# Altium footprint library Generic Footprint.PcbLib: 160 footprints (part 17 of 20)
Each footprint in its own frame and in the unit in brackets; x right, y up, seen from the top. Pads: shape width x height; smd on the part's side, far side on the other; paste and mask are expansions set on the pad; w line width, h text height; cw(c..) or ccw(c..) is an arc to the next point about the centre after c.
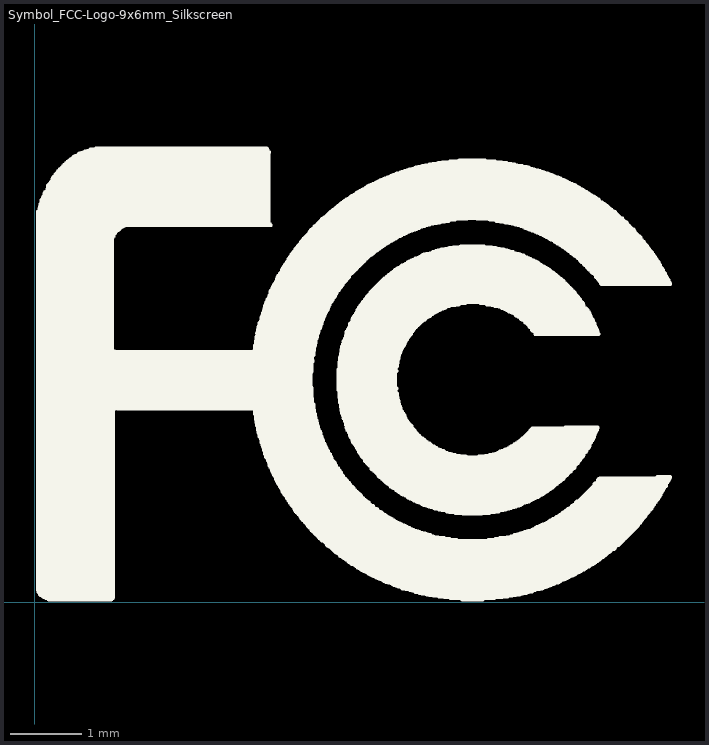
[diagram p16: the footprint, top view; thin cyan lines are the x and y axes]

## Symbol_FCC-Logo-9x6mm_Silkscreen [mm]
pads (8620):
  round 0.06 on Top Overlay: 1(0.042,0.176) 1(0.042,0.186) 1(0.042,0.196) 1(0.042,0.206) 1(0.042,0.216) 1(0.042,0.227) 1(0.042,0.237) 1(0.042,0.247) 1(0.042,0.257) 1(0.042,0.267) 1(0.042,0.278) 1(0.042,0.288) 1(0.042,0.298) 1(0.042,0.308) 1(0.042,0.318) 1(0.042,0.329) 1(0.042,0.339) 1(0.042,0.349) 1(0.042,0.359) 1(0.042,0.369) 1(0.042,0.38) 1(0.042,0.39) 1(0.042,0.4) 1(0.042,0.41) 1(0.042,0.42) 1(0.042,0.431) 1(0.042,0.441) 1(0.042,0.451) 1(0.042,0.461) 1(0.042,0.471) 1(0.042,0.482) 1(0.042,0.492) 1(0.042,0.502) 1(0.042,0.512) 1(0.042,0.522) 1(0.042,0.533) 1(0.042,0.543) 1(0.042,0.553) 1(0.042,0.563) 1(0.042,0.573) 1(0.042,0.584) 1(0.042,0.594) 1(0.042,0.604) 1(0.042,0.614) 1(0.042,0.624) 1(0.042,0.635) 1(0.042,0.645) 1(0.042,0.655) 1(0.042,0.665) 1(0.042,0.675) 1(0.042,0.686) 1(0.042,0.696) 1(0.042,0.706) 1(0.042,0.716) 1(0.042,0.726) 1(0.042,0.737) 1(0.042,0.747) 1(0.042,0.757) 1(0.042,0.767) 1(0.042,0.777) 1(0.042,0.788) 1(0.042,0.798) 1(0.042,0.808) 1(0.042,0.818) 1(0.042,0.828) 1(0.042,0.839) 1(0.042,0.849) 1(0.042,0.859) 1(0.042,0.869) 1(0.042,0.879) 1(0.042,0.89) 1(0.042,0.9) 1(0.042,0.91) 1(0.042,0.92) 1(0.042,0.93) 1(0.042,0.941) 1(0.042,0.951) 1(0.042,0.961) 1(0.042,0.971) 1(0.042,0.981) 1(0.042,0.992) 1(0.042,1.002) 1(0.042,1.012) 1(0.042,1.022) 1(0.042,1.032) 1(0.042,1.043) 1(0.042,1.053) 1(0.042,1.063) 1(0.042,1.073) 1(0.042,1.083) 1(0.042,1.094) 1(0.042,1.104) 1(0.042,1.114) 1(0.042,1.124) 1(0.042,1.134) 1(0.042,1.145) 1(0.042,1.155) 1(0.042,1.165) 1(0.042,1.175) 1(0.042,1.185) 1(0.042,1.196) 1(0.042,1.206) 1(0.042,1.216) 1(0.042,1.226) 1(0.042,1.236) 1(0.042,1.247) 1(0.042,1.257) 1(0.042,1.267) 1(0.042,1.277) 1(0.042,1.287) 1(0.042,1.298) 1(0.042,1.308) 1(0.042,1.318) 1(0.042,1.328) 1(0.042,1.338) 1(0.042,1.349) 1(0.042,1.359) 1(0.042,1.369) 1(0.042,1.379) 1(0.042,1.389) 1(0.042,1.4) 1(0.042,1.41) 1(0.042,1.42) 1(0.042,1.43) 1(0.042,1.44) 1(0.042,1.451) 1(0.042,1.461) 1(0.042,1.471) 1(0.042,1.481) 1(0.042,1.491) 1(0.042,1.502) 1(0.042,1.512) 1(0.042,1.522) 1(0.042,1.532) 1(0.042,1.542) 1(0.042,1.553) 1(0.042,1.563) 1(0.042,1.573) 1(0.042,1.583) 1(0.042,1.593) 1(0.042,1.604) 1(0.042,1.614) 1(0.042,1.624) 1(0.042,1.634) 1(0.042,1.644) 1(0.042,1.655) 1(0.042,1.665) 1(0.042,1.675) 1(0.042,1.685) 1(0.042,1.695) 1(0.042,1.706) 1(0.042,1.716) 1(0.042,1.726) 1(0.042,1.736) 1(0.042,1.746) 1(0.042,1.757) 1(0.042,1.767) 1(0.042,1.777) 1(0.042,1.787) 1(0.042,1.797) 1(0.042,1.808) 1(0.042,1.818) 1(0.042,1.828) 1(0.042,1.838) 1(0.042,1.848) 1(0.042,1.859) 1(0.042,1.869) 1(0.042,1.879) 1(0.042,1.889) 1(0.042,1.899) 1(0.042,1.91) 1(0.042,1.92) 1(0.042,1.93) 1(0.042,1.94) 1(0.042,1.95) 1(0.042,1.961) 1(0.042,1.971) 1(0.042,1.981) 1(0.042,1.991) 1(0.042,2.001) 1(0.042,2.012) 1(0.042,2.022) 1(0.042,2.032) 1(0.042,2.042) 1(0.042,2.052) 1(0.042,2.063) 1(0.042,2.073) 1(0.042,2.083) 1(0.042,2.093) 1(0.042,2.103) 1(0.042,2.114) 1(0.042,2.124) 1(0.042,2.134) 1(0.042,2.144) 1(0.042,2.154) 1(0.042,2.165) 1(0.042,2.175) 1(0.042,2.185) 1(0.042,2.195) 1(0.042,2.205) 1(0.042,2.216) 1(0.042,2.226) 1(0.042,2.236) 1(0.042,2.246) 1(0.042,2.256) 1(0.042,2.267) 1(0.042,2.277) 1(0.042,2.287) 1(0.042,2.297) 1(0.042,2.307) 1(0.042,2.318) 1(0.042,2.328) 1(0.042,2.338) 1(0.042,2.348) 1(0.042,2.358) 1(0.042,2.369) 1(0.042,2.379) 1(0.042,2.389) 1(0.042,2.399) 1(0.042,2.409) 1(0.042,2.42) 1(0.042,2.43) 1(0.042,2.44) 1(0.042,2.45) 1(0.042,2.46) 1(0.042,2.471) 1(0.042,2.481) 1(0.042,2.491) 1(0.042,2.501) 1(0.042,2.511) 1(0.042,2.522) 1(0.042,2.532) 1(0.042,2.542) 1(0.042,2.552) 1(0.042,2.562) 1(0.042,2.573) 1(0.042,2.583) 1(0.042,2.593) 1(0.042,2.603) 1(0.042,2.613) 1(0.042,2.624) 1(0.042,2.634) 1(0.042,2.644) 1(0.042,2.654) 1(0.042,2.664) 1(0.042,2.675) 1(0.042,2.685) 1(0.042,2.695) 1(0.042,2.705) 1(0.042,2.715) 1(0.042,2.726) 1(0.042,2.736) 1(0.042,2.746) 1(0.042,2.756) 1(0.042,2.766) 1(0.042,2.777) 1(0.042,2.787) 1(0.042,2.797) 1(0.042,2.807) 1(0.042,2.817) 1(0.042,2.828) 1(0.042,2.838) 1(0.042,2.848) 1(0.042,2.858) 1(0.042,2.868) 1(0.042,2.879) 1(0.042,2.889) 1(0.042,2.899) 1(0.042,2.909) 1(0.042,2.919) 1(0.042,2.93) 1(0.042,2.94) 1(0.042,2.95) 1(0.042,2.96) 1(0.042,2.97) 1(0.042,2.981) 1(0.042,2.991) 1(0.042,3.001) 1(0.042,3.011) 1(0.042,3.021) 1(0.042,3.032) 1(0.042,3.042) 1(0.042,3.052) 1(0.042,3.062) 1(0.042,3.072) 1(0.042,3.083) 1(0.042,3.093) 1(0.042,3.103) 1(0.042,3.113) 1(0.042,3.123) 1(0.042,3.134) 1(0.042,3.144) 1(0.042,3.154) 1(0.042,3.164) 1(0.042,3.174) 1(0.042,3.185) 1(0.042,3.195) 1(0.042,3.205) 1(0.042,3.215) 1(0.042,3.225) 1(0.042,3.236) 1(0.042,3.246) 1(0.042,3.256) 1(0.042,3.266) 1(0.042,3.276) 1(0.042,3.287) 1(0.042,3.297) 1(0.042,3.307) 1(0.042,3.317) 1(0.042,3.327) 1(0.042,3.338) 1(0.042,3.348) 1(0.042,3.358) 1(0.042,3.368) 1(0.042,3.378) 1(0.042,3.389) 1(0.042,3.399) 1(0.042,3.409) 1(0.042,3.419) 1(0.042,3.429) 1(0.042,3.44) 1(0.042,3.45) 1(0.042,3.46) 1(0.042,3.47) 1(0.042,3.48) 1(0.042,3.491) 1(0.042,3.501) 1(0.042,3.511) 1(0.042,3.521) 1(0.042,3.531) 1(0.042,3.542) 1(0.042,3.552) 1(0.042,3.562) 1(0.042,3.572) 1(0.042,3.582) 1(0.042,3.593) 1(0.042,3.603) 1(0.042,3.613) 1(0.042,3.623) 1(0.042,3.633) 1(0.042,3.644) 1(0.042,3.654) 1(0.042,3.664) 1(0.042,3.674) 1(0.042,3.684) 1(0.042,3.695) 1(0.042,3.705) 1(0.042,3.715) 1(0.042,3.725) 1(0.042,3.735) 1(0.042,3.746) 1(0.042,3.756) 1(0.042,3.766) 1(0.042,3.776) 1(0.042,3.786) 1(0.042,3.797) 1(0.042,3.807) 1(0.042,3.817) 1(0.042,3.827) 1(0.042,3.837) 1(0.042,3.848) 1(0.042,3.858) 1(0.042,3.868) 1(0.042,3.878) 1(0.042,3.888) 1(0.042,3.899) 1(0.042,3.909) 1(0.042,3.919) 1(0.042,3.929) 1(0.042,3.939) 1(0.042,3.95) 1(0.042,3.96) 1(0.042,3.97) 1(0.042,3.98) 1(0.042,3.99) 1(0.042,4.001) 1(0.042,4.011) 1(0.042,4.021) 1(0.042,4.031) 1(0.042,4.041) 1(0.042,4.052) 1(0.042,4.062) 1(0.042,4.072) 1(0.042,4.082) 1(0.042,4.092) 1(0.042,4.103) 1(0.042,4.113) 1(0.042,4.123) 1(0.042,4.133) 1(0.042,4.143) 1(0.042,4.154) 1(0.042,4.164) 1(0.042,4.174) 1(0.042,4.184) 1(0.042,4.194) 1(0.042,4.205) 1(0.042,4.215) 1(0.042,4.225) 1(0.042,4.235) 1(0.042,4.245) 1(0.042,4.256) 1(0.042,4.266) 1(0.042,4.276) 1(0.042,4.286) 1(0.042,4.296) 1(0.042,4.307) 1(0.042,4.317) 1(0.042,4.327) 1(0.042,4.337) 1(0.042,4.347) 1(0.042,4.358) 1(0.042,4.368) 1(0.042,4.378) 1(0.042,4.388) 1(0.042,4.398) 1(0.042,4.409) 1(0.042,4.419) 1(0.042,4.429) 1(0.042,4.439) 1(0.042,4.449) 1(0.042,4.46) 1(0.042,4.47) 1(0.042,4.48) 1(0.042,4.49) 1(0.042,4.5) 1(0.042,4.511) 1(0.042,4.521) 1(0.042,4.531) 1(0.042,4.541) 1(0.042,4.551) 1(0.042,4.562) 1(0.042,4.572) 1(0.042,4.582) 1(0.042,4.592) 1(0.042,4.602) 1(0.042,4.613) 1(0.042,4.623) 1(0.042,4.633) 1(0.042,4.643) 1(0.042,4.653) 1(0.042,4.664) 1(0.042,4.674) 1(0.042,4.684) 1(0.042,4.694) 1(0.042,4.704) 1(0.042,4.715) 1(0.042,4.725) 1(0.042,4.735) 1(0.042,4.745) 1(0.042,4.755) 1(0.042,4.766) 1(0.042,4.776) 1(0.042,4.786) 1(0.042,4.796) 1(0.042,4.806) 1(0.042,4.817) 1(0.042,4.827) 1(0.042,4.837) 1(0.042,4.847) 1(0.042,4.857) 1(0.042,4.868) 1(0.042,4.878) 1(0.042,4.888) 1(0.042,4.898) 1(0.042,4.908) 1(0.042,4.919) 1(0.042,4.929) 1(0.042,4.939) 1(0.042,4.949) 1(0.042,4.959) 1(0.042,4.97) 1(0.042,4.98) 1(0.042,4.99) 1(0.042,5) 1(0.042,5.01) 1(0.042,5.021) 1(0.042,5.031) 1(0.042,5.041) 1(0.042,5.051) 1(0.042,5.061) 1(0.042,5.072) 1(0.042,5.082) 1(0.042,5.092) 1(0.042,5.102) 1(0.042,5.112) 1(0.042,5.123) 1(0.042,5.133) 1(0.042,5.143) 1(0.042,5.153) 1(0.042,5.163) 1(0.042,5.174) 1(0.042,5.184) 1(0.042,5.194) 1(0.042,5.204) 1(0.042,5.214) 1(0.042,5.225) 1(0.042,5.235) 1(0.042,5.245) 1(0.042,5.255) 1(0.042,5.265) 1(0.042,5.276) 1(0.042,5.286) 1(0.042,5.296) 1(0.042,5.306) 1(0.042,5.316) 1(0.042,5.327) 1(0.042,5.337) 1(0.042,5.347) 1(0.042,5.357) 1(0.042,5.367) 1(0.042,5.378) 1(0.042,5.388) 1(0.042,5.398) 1(0.042,5.408) 1(0.042,5.418) 1(0.042,5.429) 1(0.042,5.439) 1(0.042,5.449) 1(0.042,5.459) 1(0.042,5.469) 1(0.042,5.48) 1(0.052,0.145) 1(0.062,0.155) 1(0.062,0.196) 1(0.062,0.206) 1(0.062,0.216) 1(0.062,0.227) 1(0.062,0.237) 1(0.062,0.247) 1(0.062,0.257) 1(0.062,0.267) 1(0.062,0.278) 1(0.062,0.288) 1(0.062,0.298) 1(0.062,0.308) 1(0.062,0.318) 1(0.062,0.329) 1(0.062,0.339) 1(0.062,0.349) 1(0.062,0.359) 1(0.062,0.369) 1(0.062,0.38) 1(0.062,0.39) 1(0.062,0.4) 1(0.062,0.41) 1(0.062,0.42) 1(0.062,0.431) 1(0.062,0.441) 1(0.062,0.451) 1(0.062,0.461) 1(0.062,0.471) 1(0.062,0.482) 1(0.062,0.492) 1(0.062,0.502) 1(0.062,0.512) 1(0.062,0.522) 1(0.062,0.533) 1(0.062,0.543) 1(0.062,0.553) 1(0.062,0.563) 1(0.062,0.573) 1(0.062,0.584) 1(0.062,0.594) 1(0.062,0.604) 1(0.062,0.614) 1(0.062,0.624) 1(0.062,0.635) 1(0.062,0.645) 1(0.062,0.655) 1(0.062,0.665) 1(0.062,0.675) 1(0.062,0.686) 1(0.062,0.696) 1(0.062,0.706) 1(0.062,0.716) 1(0.062,0.726) 1(0.062,0.737) 1(0.062,0.747) 1(0.062,0.757) 1(0.062,0.767) 1(0.062,0.777) 1(0.062,0.788) 1(0.062,0.798) 1(0.062,0.808) 1(0.062,0.818) 1(0.062,0.828) 1(0.062,0.839) 1(0.062,0.849) 1(0.062,0.859) 1(0.062,0.869) 1(0.062,0.879) 1(0.062,0.89) 1(0.062,0.9) 1(0.062,0.91) 1(0.062,0.92) 1(0.062,0.93) 1(0.062,0.941) 1(0.062,0.951) 1(0.062,0.961) 1(0.062,0.971) 1(0.062,0.981) 1(0.062,0.992) 1(0.062,1.002) 1(0.062,1.012) 1(0.062,1.022) 1(0.062,1.032) 1(0.062,1.043) 1(0.062,1.053) 1(0.062,1.063) 1(0.062,1.073) 1(0.062,1.083) 1(0.062,1.094) 1(0.062,1.104) 1(0.062,1.114) 1(0.062,1.124) 1(0.062,1.134) 1(0.062,1.145) 1(0.062,1.155) 1(0.062,1.165) 1(0.062,1.175) 1(0.062,1.185) 1(0.062,1.196) 1(0.062,1.206) 1(0.062,1.216) 1(0.062,1.226) 1(0.062,1.236) 1(0.062,1.247) 1(0.062,1.257) 1(0.062,1.267) 1(0.062,1.277) 1(0.062,1.287) 1(0.062,1.298) 1(0.062,1.308) 1(0.062,1.318) 1(0.062,1.328) 1(0.062,1.338) 1(0.062,1.349) 1(0.062,1.359) 1(0.062,1.369) 1(0.062,1.379) 1(0.062,1.389) 1(0.062,1.4) 1(0.062,1.41) 1(0.062,1.42) 1(0.062,1.43) 1(0.062,1.44) 1(0.062,1.451) 1(0.062,1.461) 1(0.062,1.471) 1(0.062,1.481) 1(0.062,1.491) 1(0.062,1.502) 1(0.062,1.512) 1(0.062,1.522) 1(0.062,1.532) 1(0.062,1.542) 1(0.062,1.553) 1(0.062,1.563) 1(0.062,1.573) 1(0.062,1.583) 1(0.062,1.593) 1(0.062,1.604) 1(0.062,1.614) 1(0.062,1.624) 1(0.062,1.634) 1(0.062,1.644) 1(0.062,1.655) 1(0.062,1.665) 1(0.062,1.675) 1(0.062,1.685) 1(0.062,1.695) 1(0.062,1.706) 1(0.062,1.716) 1(0.062,1.726) 1(0.062,1.736) 1(0.062,1.746) 1(0.062,1.757) 1(0.062,1.767) 1(0.062,1.777) 1(0.062,1.787) 1(0.062,1.797) 1(0.062,1.808) 1(0.062,1.818) 1(0.062,1.828) 1(0.062,1.838) 1(0.062,1.848) 1(0.062,1.859) 1(0.062,1.869) 1(0.062,1.879) 1(0.062,1.889) 1(0.062,1.899) 1(0.062,1.91) 1(0.062,1.92) 1(0.062,1.93) 1(0.062,1.94) 1(0.062,1.95) 1(0.062,1.961) 1(0.062,1.971) 1(0.062,1.981) 1(0.062,1.991) 1(0.062,2.001) 1(0.062,2.012) 1(0.062,2.022) 1(0.062,2.032) 1(0.062,2.042) 1(0.062,2.052) 1(0.062,2.063) 1(0.062,2.073) 1(0.062,2.083) 1(0.062,2.093) 1(0.062,2.103) 1(0.062,2.114) 1(0.062,2.124) 1(0.062,2.134) 1(0.062,2.144) 1(0.062,2.154) 1(0.062,2.165) 1(0.062,2.175) 1(0.062,2.185) 1(0.062,2.195) 1(0.062,2.205) 1(0.062,2.216) 1(0.062,2.226) 1(0.062,2.236) 1(0.062,2.246) 1(0.062,2.256) 1(0.062,2.267) 1(0.062,2.277) 1(0.062,2.287) 1(0.062,2.297) 1(0.062,2.307) 1(0.062,2.318) 1(0.062,2.328) 1(0.062,2.338) 1(0.062,2.348) 1(0.062,2.358) 1(0.062,2.369) 1(0.062,2.379) 1(0.062,2.389) 1(0.062,2.399) 1(0.062,2.409) 1(0.062,2.42) 1(0.062,2.43) 1(0.062,2.44) 1(0.062,2.45) 1(0.062,2.46) 1(0.062,2.471) 1(0.062,2.481) 1(0.062,2.491) 1(0.062,2.501) 1(0.062,2.511) 1(0.062,2.522) 1(0.062,2.532) 1(0.062,2.542) 1(0.062,2.552) 1(0.062,2.562) 1(0.062,2.573) 1(0.062,2.583) 1(0.062,2.593) 1(0.062,2.603) 1(0.062,2.613) 1(0.062,2.624) 1(0.062,2.634) 1(0.062,2.644) 1(0.062,2.654) 1(0.062,2.664) 1(0.062,2.675) 1(0.062,2.685) 1(0.062,2.695) 1(0.062,2.705) 1(0.062,2.715) 1(0.062,2.726) 1(0.062,2.736) 1(0.062,2.746) 1(0.062,2.756) 1(0.062,2.766) 1(0.062,2.777) 1(0.062,2.787) 1(0.062,2.797) 1(0.062,2.807) 1(0.062,2.817) 1(0.062,2.828) 1(0.062,2.838) 1(0.062,2.848) 1(0.062,2.858) 1(0.062,2.868) 1(0.062,2.879) 1(0.062,2.889) 1(0.062,2.899) 1(0.062,2.909) 1(0.062,2.919) 1(0.062,2.93) 1(0.062,2.94) 1(0.062,2.95) 1(0.062,2.96) 1(0.062,2.97) 1(0.062,2.981) 1(0.062,2.991) 1(0.062,3.001) 1(0.062,3.011) 1(0.062,3.021) 1(0.062,3.032) 1(0.062,3.042) 1(0.062,3.052) 1(0.062,3.062) 1(0.062,3.072) 1(0.062,3.083) 1(0.062,3.093) 1(0.062,3.103) 1(0.062,3.113) 1(0.062,3.123) 1(0.062,3.134) 1(0.062,3.144) 1(0.062,3.154) 1(0.062,3.164) 1(0.062,3.174) 1(0.062,3.185) 1(0.062,3.195) 1(0.062,3.205) 1(0.062,3.215) 1(0.062,3.225) 1(0.062,3.236) 1(0.062,3.246) 1(0.062,3.256) 1(0.062,3.266) 1(0.062,3.276) 1(0.062,3.287) 1(0.062,3.297) 1(0.062,3.307) 1(0.062,3.317) 1(0.062,3.327) 1(0.062,3.338) 1(0.062,3.348) 1(0.062,3.358) 1(0.062,3.368) 1(0.062,3.378) 1(0.062,3.389) 1(0.062,3.399) 1(0.062,3.409) 1(0.062,3.419) 1(0.062,3.429) 1(0.062,3.44) 1(0.062,3.45) 1(0.062,3.46) 1(0.062,3.47) 1(0.062,3.48) 1(0.062,3.491) 1(0.062,3.501) 1(0.062,3.511) 1(0.062,3.521) 1(0.062,3.531) 1(0.062,3.542) 1(0.062,3.552) 1(0.062,3.562) 1(0.062,3.572) 1(0.062,3.582) 1(0.062,3.593) 1(0.062,3.603) 1(0.062,3.613) 1(0.062,3.623) 1(0.062,3.633) 1(0.062,3.644) 1(0.062,3.654) 1(0.062,3.664) 1(0.062,3.674) 1(0.062,3.684) 1(0.062,3.695) 1(0.062,3.705) 1(0.062,3.715) 1(0.062,3.725) 1(0.062,3.735) 1(0.062,3.746) 1(0.062,3.756) 1(0.062,3.766) 1(0.062,3.776) 1(0.062,3.786) 1(0.062,3.797) 1(0.062,3.807) 1(0.062,3.817) 1(0.062,3.827) 1(0.062,3.837) 1(0.062,3.848) 1(0.062,3.858) 1(0.062,3.868) 1(0.062,3.878) 1(0.062,3.888) 1(0.062,3.899) 1(0.062,3.909) 1(0.062,3.919) 1(0.062,3.929) 1(0.062,3.939) 1(0.062,3.95) 1(0.062,3.96) 1(0.062,3.97) 1(0.062,3.98) 1(0.062,3.99) 1(0.062,4.001) 1(0.062,4.011) 1(0.062,4.021) 1(0.062,4.031) 1(0.062,4.041) 1(0.062,4.052) 1(0.062,4.062) 1(0.062,4.072) 1(0.062,4.082) 1(0.062,4.092) 1(0.062,4.103) 1(0.062,4.113) 1(0.062,4.123) 1(0.062,4.133) 1(0.062,4.143) 1(0.062,4.154) 1(0.062,4.164) 1(0.062,4.174) 1(0.062,4.184) 1(0.062,4.194) 1(0.062,4.205) 1(0.062,4.215) 1(0.062,4.225) 1(0.062,4.235) 1(0.062,4.245) 1(0.062,4.256) 1(0.062,4.266) 1(0.062,4.276) 1(0.062,4.286) 1(0.062,4.296) 1(0.062,4.307) 1(0.062,4.317) 1(0.062,4.327) 1(0.062,4.337) 1(0.062,4.347) 1(0.062,4.358) 1(0.062,4.368) 1(0.062,4.378) 1(0.062,4.388) 1(0.062,4.398) 1(0.062,4.409) 1(0.062,4.419) 1(0.062,4.429) 1(0.062,4.439) 1(0.062,4.449) 1(0.062,4.46) 1(0.062,4.47) 1(0.062,4.48) 1(0.062,4.49) 1(0.062,4.5) 1(0.062,4.511) 1(0.062,4.521) 1(0.062,4.531) 1(0.062,4.541) 1(0.062,4.551) 1(0.062,4.562) 1(0.062,4.572) 1(0.062,4.582) 1(0.062,4.592) 1(0.062,4.602) 1(0.062,4.613) 1(0.062,4.623) 1(0.062,4.633) 1(0.062,4.643) 1(0.062,4.653) 1(0.062,4.664) 1(0.062,4.674) 1(0.062,4.684) 1(0.062,4.694) 1(0.062,4.704) 1(0.062,4.715) 1(0.062,4.725) 1(0.062,4.735) 1(0.062,4.745) 1(0.062,4.755) 1(0.062,4.766) 1(0.062,4.776) 1(0.062,4.786) 1(0.062,4.796) 1(0.062,4.806) 1(0.062,4.817) 1(0.062,4.827) 1(0.062,4.837) 1(0.062,4.847) 1(0.062,4.857) 1(0.062,4.868) 1(0.062,4.878) 1(0.062,4.888) 1(0.062,4.898) 1(0.062,4.908) 1(0.062,4.919) 1(0.062,4.929) 1(0.062,4.939) 1(0.062,4.949) 1(0.062,4.959) 1(0.062,4.97) 1(0.062,4.98) 1(0.062,4.99) 1(0.062,5) 1(0.062,5.01) 1(0.062,5.021) 1(0.062,5.031) 1(0.062,5.041) 1(0.062,5.051) 1(0.062,5.061) 1(0.062,5.072) 1(0.062,5.082) 1(0.062,5.092) 1(0.062,5.102) 1(0.062,5.112) 1(0.062,5.123) 1(0.062,5.133) 1(0.062,5.143) 1(0.062,5.153) 1(0.062,5.163) 1(0.062,5.174) 1(0.062,5.184) 1(0.062,5.194) 1(0.062,5.204) 1(0.062,5.214) 1(0.062,5.225) 1(0.062,5.235) 1(0.062,5.245) 1(0.062,5.255) 1(0.062,5.265) 1(0.062,5.276) 1(0.062,5.286) 1(0.062,5.296) 1(0.062,5.306) 1(0.062,5.316) 1(0.062,5.327) 1(0.062,5.337) 1(0.062,5.347) 1(0.062,5.357) 1(0.062,5.367) 1(0.062,5.378) 1(0.062,5.388) 1(0.062,5.398) 1(0.062,5.408) 1(0.062,5.418) 1(0.062,5.429) 1(0.062,5.439) 1(0.062,5.449) 1(0.062,5.459) 1(0.062,5.48) 1(0.062,5.49) 1(0.062,5.5) 1(0.062,5.51) 1(0.062,5.52) 1(0.072,0.114) 1(0.072,0.125) 1(0.072,0.145) 1(0.072,0.165) 1(0.072,0.196) 1(0.072,0.206) 1(0.072,0.216) 1(0.072,0.227) 1(0.072,0.237) 1(0.072,0.247) 1(0.072,0.257) 1(0.072,0.267) 1(0.072,0.278) 1(0.072,0.288) 1(0.072,0.298) 1(0.072,0.308) 1(0.072,0.318) 1(0.072,0.329) 1(0.072,0.339) 1(0.072,0.349) 1(0.072,0.359) 1(0.072,0.369) 1(0.072,0.38) 1(0.072,0.39) 1(0.072,0.4) 1(0.072,0.41) 1(0.072,0.42) 1(0.072,0.431) 1(0.072,0.441) 1(0.072,0.451) 1(0.072,0.461) 1(0.072,0.471) 1(0.072,0.482) 1(0.072,0.492) 1(0.072,0.502) 1(0.072,0.512) 1(0.072,0.522) 1(0.072,0.533) 1(0.072,0.543) 1(0.072,0.553) 1(0.072,0.563) 1(0.072,0.573) 1(0.072,0.584) 1(0.072,0.594) 1(0.072,0.604) 1(0.072,0.614) 1(0.072,0.624) 1(0.072,0.635) 1(0.072,0.645) 1(0.072,0.655) 1(0.072,0.665) 1(0.072,0.675) 1(0.072,0.686) 1(0.072,0.696) 1(0.072,0.706) 1(0.072,0.716) 1(0.072,0.726) 1(0.072,0.737) 1(0.072,0.747) 1(0.072,0.757) 1(0.072,0.767) 1(0.072,0.777) 1(0.072,0.788) 1(0.072,0.798) 1(0.072,0.808) 1(0.072,0.818) 1(0.072,0.828) 1(0.072,0.839) 1(0.072,0.849) 1(0.072,0.859) 1(0.072,0.869) 1(0.072,0.879) 1(0.072,0.89) 1(0.072,0.9) 1(0.072,0.91) 1(0.072,0.92) 1(0.072,0.93) 1(0.072,0.941) 1(0.072,0.951) 1(0.072,0.961) 1(0.072,0.971) 1(0.072,0.981) 1(0.072,0.992) 1(0.072,1.002) 1(0.072,1.012) 1(0.072,1.022) 1(0.072,1.032) 1(0.072,1.043) 1(0.072,1.053) 1(0.072,1.063) 1(0.072,1.073) 1(0.072,1.083) 1(0.072,1.094) 1(0.072,1.104) 1(0.072,1.114) 1(0.072,1.124) 1(0.072,1.134) 1(0.072,1.145) 1(0.072,1.155) 1(0.072,1.165) 1(0.072,1.175) 1(0.072,1.185) 1(0.072,1.196) 1(0.072,1.206) 1(0.072,1.216) 1(0.072,1.226) 1(0.072,1.236) 1(0.072,1.247) 1(0.072,1.257) 1(0.072,1.267) 1(0.072,1.277) 1(0.072,1.287) 1(0.072,1.298) 1(0.072,1.308) 1(0.072,1.318) 1(0.072,1.328) 1(0.072,1.338) 1(0.072,1.349) 1(0.072,1.359) 1(0.072,1.369) 1(0.072,1.379) 1(0.072,1.389) 1(0.072,1.4) 1(0.072,1.41) 1(0.072,1.42) 1(0.072,1.43) 1(0.072,1.44) 1(0.072,1.451) 1(0.072,1.461) 1(0.072,1.471) 1(0.072,1.481) 1(0.072,1.491) 1(0.072,1.502) 1(0.072,1.512) 1(0.072,1.522) 1(0.072,1.532) 1(0.072,1.542) 1(0.072,1.553) 1(0.072,1.563) 1(0.072,1.573) 1(0.072,1.583) 1(0.072,1.593) 1(0.072,1.604) 1(0.072,1.614) 1(0.072,1.624) 1(0.072,1.634) 1(0.072,1.644) 1(0.072,1.655) 1(0.072,1.665) 1(0.072,1.675) 1(0.072,1.685) 1(0.072,1.695) 1(0.072,1.706) 1(0.072,1.716) 1(0.072,1.726) 1(0.072,1.736) 1(0.072,1.746) 1(0.072,1.757) 1(0.072,1.767) 1(0.072,1.777) 1(0.072,1.787) 1(0.072,1.797) 1(0.072,1.808) 1(0.072,1.818) 1(0.072,1.828) 1(0.072,1.838) 1(0.072,1.848) 1(0.072,1.859) 1(0.072,1.869) 1(0.072,1.879) 1(0.072,1.889) 1(0.072,1.899) 1(0.072,1.91) 1(0.072,1.92) 1(0.072,1.93) 1(0.072,1.94) 1(0.072,1.95) 1(0.072,1.961) 1(0.072,1.971) 1(0.072,1.981) 1(0.072,1.991) 1(0.072,2.001) 1(0.072,2.012) 1(0.072,2.022) 1(0.072,2.032) 1(0.072,2.042) 1(0.072,2.052) 1(0.072,2.063) 1(0.072,2.073) 1(0.072,2.083) 1(0.072,2.093) 1(0.072,2.103) 1(0.072,2.114) 1(0.072,2.124) 1(0.072,2.134) 1(0.072,2.144) 1(0.072,2.154) 1(0.072,2.165) 1(0.072,2.175) 1(0.072,2.185) 1(0.072,2.195) 1(0.072,2.205) 1(0.072,2.216) 1(0.072,2.226) 1(0.072,2.236) 1(0.072,2.246) 1(0.072,2.256) 1(0.072,2.267) 1(0.072,2.277) 1(0.072,2.287) 1(0.072,2.297) 1(0.072,2.307) 1(0.072,2.318) 1(0.072,2.328) 1(0.072,2.338) 1(0.072,2.348) 1(0.072,2.358) 1(0.072,2.369) 1(0.072,2.379) 1(0.072,2.389) 1(0.072,2.399) 1(0.072,2.409) 1(0.072,2.42) 1(0.072,2.43) 1(0.072,2.44) 1(0.072,2.45) 1(0.072,2.46) 1(0.072,2.471) 1(0.072,2.481) 1(0.072,2.491) 1(0.072,2.501) 1(0.072,2.511) 1(0.072,2.522) 1(0.072,2.532) 1(0.072,2.542) 1(0.072,2.552) 1(0.072,2.562) 1(0.072,2.573) 1(0.072,2.583) 1(0.072,2.593) 1(0.072,2.603) 1(0.072,2.613) 1(0.072,2.624) 1(0.072,2.634) 1(0.072,2.644) 1(0.072,2.654) 1(0.072,2.664) 1(0.072,2.675) 1(0.072,2.685) 1(0.072,2.695) 1(0.072,2.705) 1(0.072,2.715) 1(0.072,2.726) 1(0.072,2.736) 1(0.072,2.746) 1(0.072,2.756) 1(0.072,2.766) 1(0.072,2.777) 1(0.072,2.787) 1(0.072,2.797) 1(0.072,2.807) 1(0.072,2.817) 1(0.072,2.828) 1(0.072,2.838) 1(0.072,2.848) 1(0.072,2.858) 1(0.072,2.868) 1(0.072,2.879) 1(0.072,2.889) 1(0.072,2.899) 1(0.072,2.909) 1(0.072,2.919) 1(0.072,2.93) 1(0.072,2.94) 1(0.072,2.95) 1(0.072,2.96) 1(0.072,2.97) 1(0.072,2.981) 1(0.072,2.991) 1(0.072,3.001) 1(0.072,3.011) 1(0.072,3.021) 1(0.072,3.032) 1(0.072,3.042) 1(0.072,3.052) 1(0.072,3.062) 1(0.072,3.072) 1(0.072,3.083) 1(0.072,3.093) 1(0.072,3.103) 1(0.072,3.113) 1(0.072,3.123) 1(0.072,3.134) 1(0.072,3.144) 1(0.072,3.154) 1(0.072,3.164) 1(0.072,3.174) 